# Altium footprint library Key & Switch's.PcbLib: 58 footprints (part 3 of 4)
Each footprint in its own frame and in the unit in brackets; x right, y up, seen from the top. Pads: shape width x height; smd on the part's side, far side on the other; paste and mask are expansions set on the pad; w line width, h text height; cw(c..) or ccw(c..) is an arc to the next point about the centre after c.
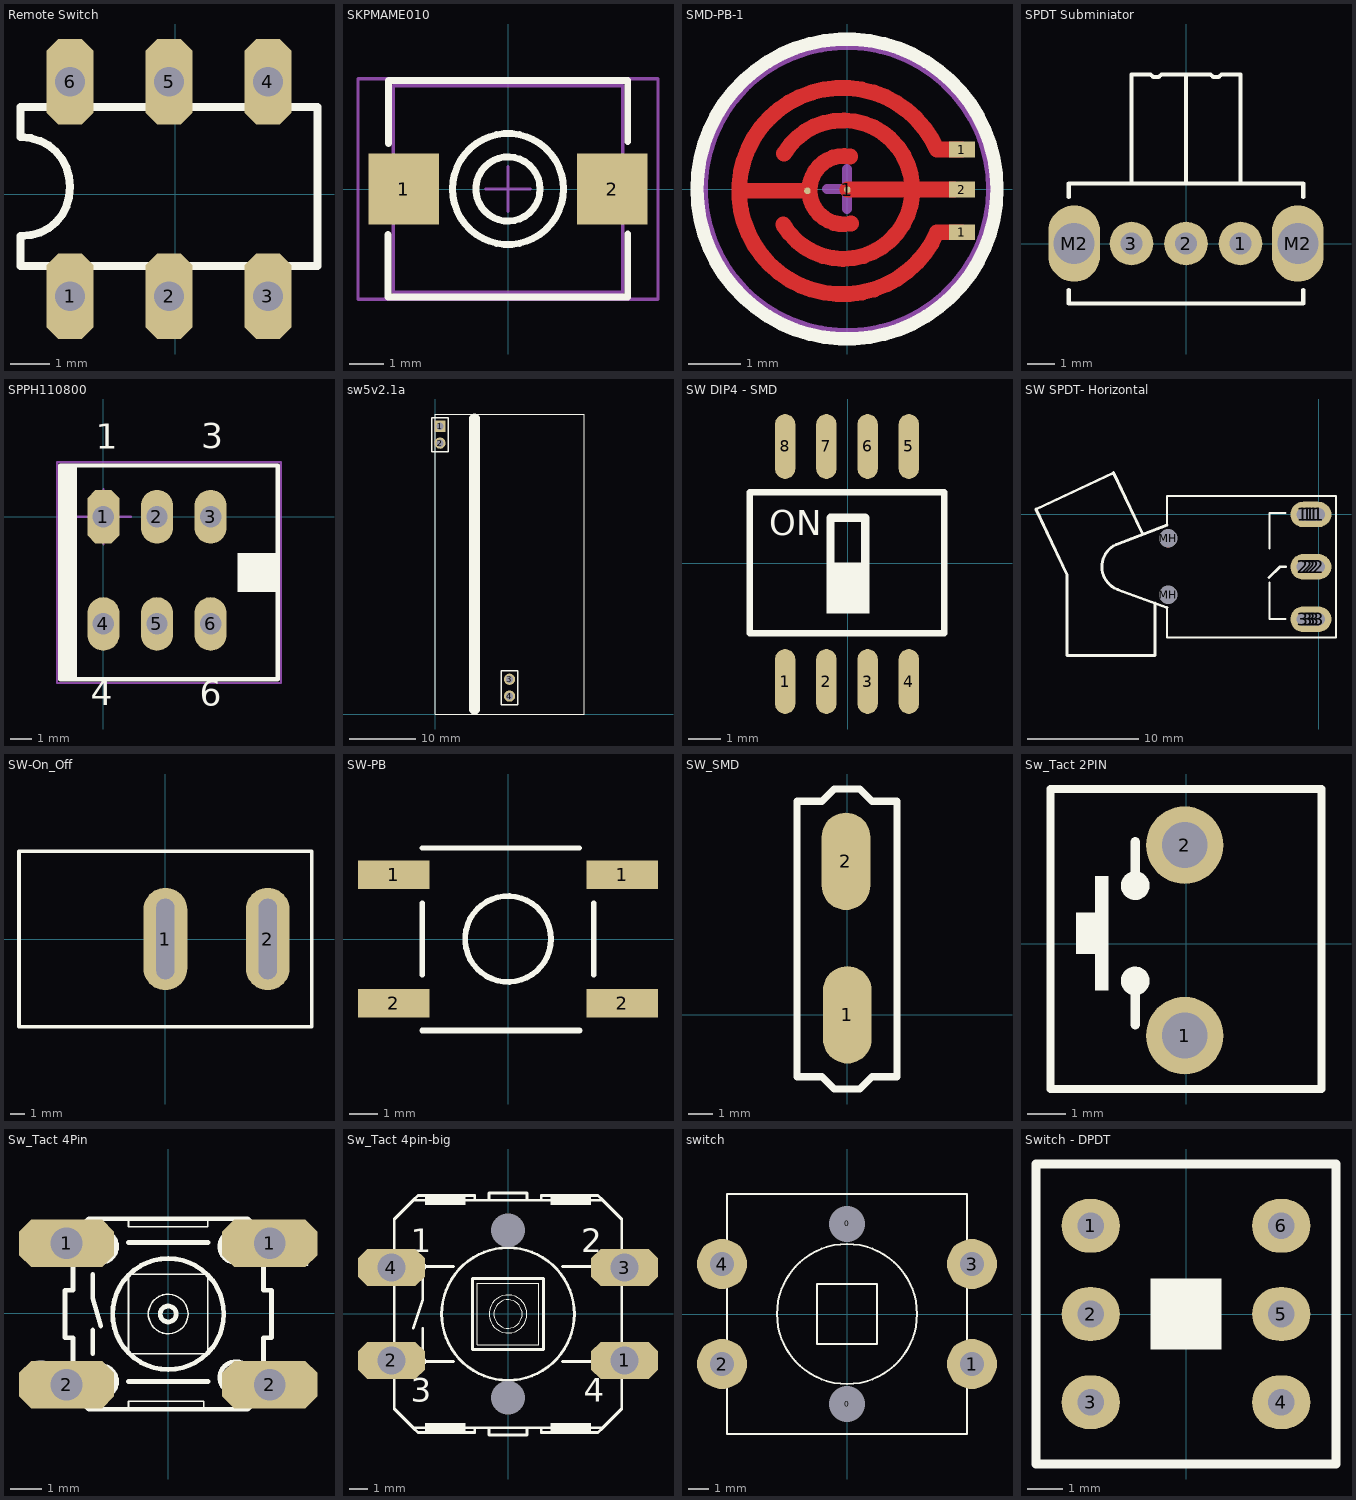
[diagram p2: the footprints below, top view; thin cyan lines are the x and y axes]

## Remote Switch [mm]
height 0.508
pads (6):
  oct 1.2x2.2 hole 0.762: 1(-2.702,-2.614) 2(-0.162,-2.614) 3(2.378,-2.614) 4(2.378,2.885) 5(-0.162,2.885) 6(-2.702,2.885)
Top Overlay:
  lines w0.203: -3.972,-1.845 3.648,-1.845 3.648,2.235 -3.972,2.235 -3.972,1.465 -3.705,1.44 -3.464,1.366 -3.245,1.252 -3.06,1.097 -2.91,0.909 -2.796,0.693 -2.727,0.454 -2.702,0.195 -2.727,-0.072 -2.796,-0.313 -2.91,-0.531 -3.06,-0.717 -3.245,-0.867 -3.464,-0.981 -3.705,-1.05 -3.972,-1.075 -3.972,-1.845
3D body "User Library-MPS-700.STEP": height 14.2, standoff -1.7, extent -3.65,-3.35 3.35,3.65

## SKPMAME010 [mil] "6.0×5.9mm Low Contact Resistance Type (Surface Mount) SKPM Series"
pads (2):
  rect 80x80 smd: 1(-118,0) 2(118,0)
Top Overlay:
  circle w7.87: c0,0 r62.85
  circle w7.87: c0,0 r36.4
  lines w7.87: -136.14,-51.5 -136.14,-122.19 135.71,-122.19 135.71,-51 ; -135.37,51.5 -135.37,123.04 135.72,123.04 135.72,54
Mechanical 1:
  lines w3.94: -129.92,-116.93 129.92,-116.93 129.92,116.93 -129.92,116.93 -129.92,-116.93
Mechanical 15:
  lines w3.94: -25,0 25,0 ; 0,-25 0,25 ; -170,-125 170,-125 170,125 -170,125 -170,-125
3D body "SKPMAM.STEP": height 196.85, standoff 0, extent -129.92,-116.93 129.92,116.93

## SMD-PB-1 [mm]
pads (6):
  round 0.127 smd: 1(-0.761,-0.035) 2(0.007,-0.012)
  round 4.928 on Top Solder: 1(0.007,-0.012)
  rect 0.5x0.305 smd: 1(2.204,-0.829) 1(2.204,0.758) 2(2.204,-0.012)
Top Layer:
  lines w0.305: -2.063,-0.035 -0.761,-0.035 ; -1.223,-0.684 ccw(c-0.076,-0.012) -1.213,0.678 ; 0.007,-0.012 2.044,-0.012 ; 0.062,0.623 ccw(c-0.064,-0.021) 0.077,-0.662 ; 2.201,0.758 1.726,0.758 ccw(c-0.089,-0.039) 1.729,-0.829 2.204,-0.829
Top Overlay:
  circle w0.254: c0,0 r2.879
Mechanical 15:
  circle w0.254: c0,0 r2.797
  lines w0.2: -0.381,0 0.381,0 ; 0,-0.381 0,0.381

## SPDT Subminiator [mm] "Subminiator SPDT switch"
pads (5):
  round 1.6 hole 0.8: 1(2,0) 2(0,0) 3(-2,0)
  oval 1.9x2.8 hole 1.5: M2(-4.1,0) M2(4.1,0)
Top Overlay:
  lines w0.15: -4.3,-1.7 -4.3,-2.2 4.3,-2.2 4.3,-1.7 ; -4.3,1.7 -4.3,2.2 4.3,2.2 4.3,1.7 ; -2,2.2 -2,6.2 ; 0,2.2 0,6.2 ; 2,2.2 2,6.2 1.3,6.2 1.2,6.1 1,6.1 0.9,6.2 0,6.2 ; -2,6.2 -1.3,6.2 -1.2,6.1 -1,6.1 -0.9,6.2 0,6.2 ; -2,6.2 -2,6.2 ; 0,6.2 0,6.2 ; 0,6.2 0,6.2
3D body "User Library-CK_Slide.step": height 4.7, standoff -2.79, extent -4.311,-2.28 4.3,6.093

## SPPH110800 [mm] "1.5mm-travel Vertical Type SPPH1 Series"
height 8
pads (6):
  oct 1.5x2.5 hole 1: 1(0,0)
  oval 1.5x2.5 hole 1: 2(2.5,0) 3(5,0) 4(0,-5) 5(2.5,-5) 6(5,-5)
Top Overlay:
  rectangle: -1.994,-7.544 -1.219,2.438
  rectangle: 6.248,-3.518 8.23,-1.702
  lines w0.203: -2.007,-7.582 8.128,-7.582 8.128,2.388 -2.007,2.388 -2.007,-7.582
  text "1" at -0.356,2.769 h2
  text "3" at 4.572,2.791 h2
  text "4" at -0.584,-9.192 h2
  text "6" at 4.496,-9.198 h2
Mechanical 15:
  lines w0.1: -1.283,0 1.283,0 ; 0,-1.283 0,1.283 ; -2.159,-7.747 7.671,-7.747 8.28,-7.747 8.28,2.54 -2.159,2.54 -2.159,-7.747
3D body "SPPH110800.STEP": height 17.5, standoff -3.5, extent -1.977,-7.464 8.023,2.536

## sw5v2.1a [mm]
pads (4):
  rect 1.7x1.7 hole 1.1: 1(0.7,43.44)
  round 1.7 hole 1.1: 2(0.7,40.9) 3(11.2,5.24) 4(11.2,2.7)
Top Overlay:
  lines w0.127: 0,0 22.5,0 22.5,45.3 20.9,45.3 0,45.3 0,0
  lines w0.2: -0.57,39.63 -0.57,44.71 1.97,44.71 1.97,39.63 -0.57,39.63 ; 9.93,1.43 12.47,1.43 12.47,6.51 9.93,6.51 9.93,1.43
  lines w1.6: 5.9,0.7 5.9,44.6

## SW DIP4 - SMD [mm]
pads (8):
  oval 0.625x2 smd: 1(-1.93,-3.641) 2(-0.66,-3.641) 3(0.61,-3.641) 4(1.88,-3.641) 5(1.88,3.591) 6(0.61,3.591) 7(-0.66,3.591) 8(-1.93,3.591)
Top Overlay:
  rectangle: -0.66,-1.549 0.66,0.025
  lines w0.2: -3.023,-2.159 -3.023,2.184 2.972,2.184 2.972,-2.159 -3.023,-2.159
  lines w0.254: -0.533,0.025 -0.533,1.397 0.533,1.397 0.533,0.025
  text "ON" at -2.413,0.864 h0.76
3D body "User Library-TDA04.STEP": height 2.35, standoff 0, extent -3.106,-4.066 3.104,4.067

## SW SPDT- Horizontal [mil]
pads (17):
  round 90 hole 45: 1(-55.12,0) 1(-39.37,0) 1(-15.75,0) 1(0,0) 2(-55.12,-185.04) 2(-39.37,-185.04) 2(-15.75,-185.04) 2(0,-185.04) 3(-55.12,-370.08) 3(-39.37,-370.08) 3(-15.75,-370.08) 3(0,-370.08)
  oval 140x90 hole 45: 1(-27.56,-0.04) 2(-27.56,-185.04) 3(-27.56,-370.04)
  round 63 hole 65: MH(-531.5,-283.46) MH(-531.5,-84.68)
Top Overlay:
  lines w7: -535.43,-329.21 -535.43,-435.04 61.24,-435.04 61.24,64.96 -535.43,64.96 -535.43,-37.31 ; -174.56,-240.04 -174.56,-370.04 -117.56,-370.04 ; -174.56,-120.04 -174.56,4.96 -117.56,4.96
  lines w10: -715.87,-106.44 ccw(c-680.11,-184.58) -711.99,-264.38 ; -714.57,-106.3 -535.43,-37.31 ; -709.7,-265.56 -535.43,-329.21 ; -622.75,-66.04 -724.75,147.96 -998.75,18.96 -888.75,-214.04 -888.75,-498.04 -577.75,-498.04 -577.75,-313.04 ; -175.75,-223.04 -137.56,-185.04 -117.56,-185.04
3D body "SW3dPS-300-sp1-j1-blk.STEP": height 379.35, standoff -125.15, extent -1002.19,-497.79 1.31,151.08

## SW-On_Off [mm]
pads (2):
  oval 3x7 / inner oval 3x7 / far side rect 3x7 hole 1.25 slot 5.5 at 90 deg: 1(0,0) 2(7,0)
Top Overlay:
  lines w0.254: -10,-6 10,-6 10,6 -10,6 -10,-6
3D body "button-1.STEP": height 16.8, standoff -8, extent -11.25,-8.5 11.25,8.5

## SW-PB [mm]
pads (4):
  rect 2.5x1 smd: 1(-3.992,2.25) 1(3.992,2.25) 2(-3.992,-2.25) 2(3.992,-2.25)
Top Overlay:
  circle w0.2: c0,0 r1.5
  lines w0.178: -2.997,3.175 2.503,3.175
  lines w0.2: -3,-1.25 -3,1.25 ; -2.997,-3.2 2.503,-3.2 ; 3,-1.25 3,1.25
3D body "SW3dPS-switch.STEP": height 5, standoff 0, extent -4.5,-3 4.5,3

## SW_SMD [mm]
pads (2):
  oval 2x4 smd: 1(0,0) 2(-0.06,6.3)
Top Overlay:
  lines w0.3: -2.07,-2.54 -2.07,8.763 -1.042,8.763 -0.534,9.271 0.505,9.271 1.013,8.763 2.04,8.763 2.04,-2.54 1.013,-2.54 0.505,-3.048 -0.534,-3.048 -1.042,-2.54 -2.07,-2.54
3D body "Tactile Switch SMD 6x3.6mm H=2.5mm RS-282G05A3-SM RT.stp": height 2.5, standoff -0.02, extent -1.8,-0.825 1.8,7.175

## Sw_Tact 2PIN [mil]
height 20
pads (2):
  round 80 hole 47.24: 1(-1.36,-94.82) 2(-1.36,102.08)
Top Overlay:
  circle w10: c-52.44,60.12 r9.84
  circle w10: c-52.44,-38.31 r9.84
  region: -93.78,69.96 -93.78,32.56 -80,32.56 -80,69.96
  region: -113.46,32.56 -113.46,5 -80,5 -80,32.56
  region: -80,-10.75 -80,16.81 -113.46,16.81 -113.46,-10.75
  region: -80,-48.15 -80,-10.75 -93.78,-10.75 -93.78,-48.15
  lines w8: -140,-150 -140,160 140,160 140,-150 -140,-150
  lines w10: -52.44,-83.59 -52.44,-38.31 ; -52.44,60.12 -52.44,105.39
3D body "19977.stp": height 433.07, standoff -314.96, extent -118.11,-113.19 125.98,123.03

## Sw_Tact 4Pin [mil]
pads (4):
  oct 120x60 hole 40: 1(-128.03,87.92) 1(127.97,87.92) 2(-128.03,-90.08) 2(127.97,-90.08)
Top Overlay:
  circle w6: c-0.03,-1.08 r70
  circle w6: c-85.03,-86.08 r20
  circle w6: c84.97,-81.08 r20
  circle w6: c84.97,83.92 r20
  circle w6: c-85.03,83.92 r20
  circle w2: c-0.03,-1.08 r25
  circle w6: c-0.03,-1.08 r10
  lines w2: -50.03,-121.08 -50.03,-111.08 44.97,-111.08 44.97,-121.08 ; -50.03,118.92 -50.03,108.92 49.97,108.92 49.97,118.92 ; -50.03,-51.08 -50.03,48.92 49.97,48.92 49.97,-51.08 -50.03,-51.08
  lines w6: -95.03,-51.08 -95.03,-21.08 ; -95.03,48.92 -95.03,18.92 -85.03,-16.08 ; -50.03,-86.08 49.97,-86.08 ; -50.03,88.92 49.97,88.92 ; -130.03,-31.08 -130.03,28.92 -120.03,28.92 -120.03,38.92 -120.03,98.92 -100.03,118.92 -85.03,118.92 -50.03,118.92 49.97,118.92 84.97,118.92 99.97,118.92 119.97,98.92 119.97,38.92 119.97,28.92 129.97,28.92 129.97,-31.08 119.97,-31.08 119.97,-41.08 119.97,-101.08 99.97,-121.08 84.97,-121.08 44.97,-121.08 -50.03,-121.08 -85.03,-121.08 -100.03,-121.08 -120.03,-101.08 -120.03,-41.08 -120.03,-31.08 -130.03,-31.08
  text "1" at -170.03,63.92 h50
  text "2" at 139.97,58.92 h50
  text "3" at -180.03,-111.08 h50
  text "4" at 139.97,-111.08 h50
3D body "SW3dPS-cb001a.STEP": height 179.13, standoff -114.17, extent -132.05,-117.12 127.95,119.09

## Sw_Tact 4pin-big [mm]
pads (6):
  oct 3.582x2 hole 1.5: 1(6.248,-2.492) 2(-6.248,-2.492) 3(6.248,2.486) 4(-6.248,2.486)
  round 0 hole 1.803 unplated: ""(0,-4.499) ""(0,4.493)
Top Overlay:
  circle w0.152: c0,-0.003 r3.556
  circle w0.051: c0,-0.003 r1.016
  circle w0.051: c0,-0.003 r0.762
  circle w0.152: c-4.572,2.537 r0.127
  circle w0.152: c-4.572,-2.543 r0.127
  rectangle: 6.096,-2.924 6.604,-2.035
  rectangle: 6.096,2.029 6.604,2.918
  rectangle: -6.604,2.029 -6.096,2.918
  rectangle: -6.604,-2.924 -6.096,-2.035
  rectangle: 2.286,5.839 4.445,6.347
  rectangle: -4.445,5.839 -2.286,6.347
  rectangle: 2.286,-6.353 4.445,-5.845
  rectangle: -4.445,-6.353 -2.286,-5.845
  lines w0.051: -1.651,-1.654 1.651,-1.654 1.651,1.648 -1.651,1.648 -1.651,-1.654
  lines w0.152: -5.08,-2.543 -4.572,-2.543 ; -5.08,-0.765 -4.572,0.759 -4.572,2.537 ; -5.08,2.537 -4.572,2.537 ; -4.572,-0.765 -4.572,-2.543 ; -2.921,-2.543 -4.572,-2.543 ; -2.921,2.537 -4.572,2.537 ; 2.921,-2.543 5.08,-2.543 ; 2.921,2.537 5.08,2.537 ; -5.08,-6.099 -6.096,-5.083 -6.096,-3.813 -6.096,-1.146 -6.096,1.14 -6.096,3.807 -6.096,5.077 -5.08,6.093 ; -5.08,-6.099 -1.778,-6.099 ; -5.08,-6.099 -4.826,-6.353 -1.778,-6.353 -1.778,-6.099 ; -5.08,6.093 -1.778,6.093 ; -5.08,6.093 -4.826,6.347 -1.778,6.347 -1.778,6.093 ; -1.778,-6.099 -1.016,-6.099 ; -1.778,6.093 -1.016,6.093 ; -1.016,-6.099 -1.016,-6.48 1.016,-6.48 1.016,-6.099 ; -1.016,-6.099 1.016,-6.099 ; -1.016,6.093 -1.016,6.474 1.016,6.474 1.016,6.093 ; -1.016,6.093 1.016,6.093 ; 1.016,-6.099 1.778,-6.099 ; 1.016,6.093 1.778,6.093 ; 1.778,-6.099 1.778,-6.353 4.826,-6.353 5.08,-6.099 ; 1.778,-6.099 5.08,-6.099 ; 1.778,6.093 5.08,6.093 ; 1.778,6.093 1.778,6.347 4.826,6.347 5.08,6.093 ; 5.08,-6.099 6.096,-5.083 6.096,-3.813 6.096,-1.146 6.096,1.14 6.096,3.807 6.096,5.077 5.08,6.093 ; -1.905,-1.908 1.905,-1.908 1.905,1.902 -1.905,1.902 -1.905,-1.908
  text "1" at -5.207,3.299 h1.27
  text "2" at 3.937,3.299 h1.27
  text "3" at -5.207,-4.702 h1.27
  text "4" at 4.064,-4.702 h1.27
3D body "B3F-4050.stp": height 10.5, standoff -3, extent -6.9,-6 6.9,6

## switch [mm]
pads (6):
  rect 0.5x0.5 hole 1.8: 0(0,-4.5) 0(0,4.5)
  round 2.5 hole 1.2: 1(6.25,-2.5) 2(-6.25,-2.5) 3(6.25,2.5) 4(-6.25,2.5)
Top Overlay:
  circle w0.1: c0,0 r3.5
  lines w0.1: -6,-6 6,-6 6,6 -6,6 -6,-6 ; -1.5,-1.5 1.5,-1.5 1.5,1.5 -1.5,1.5 -1.5,-1.5

## Switch - DPDT [mil]
pads (6):
  oval 65x60 hole 30: 1(-106.3,98.43) 2(-106.3,0) 3(-106.3,-98.43) 4(106.3,-98.43) 5(106.3,0) 6(106.3,98.43)
Top Overlay:
  rectangle: -39.37,-39.37 39.37,39.37
  lines w10: -167.32,-167.32 167.32,-167.32 167.32,167.32 -167.32,167.32 -167.32,-167.32
3D body "DPDT.STEP": height 559.06, standoff -129.92, extent -167.32,-167.32 167.32,167.32